# Altium footprint library connectors.PcbLib: 98 footprints (part 3 of 7)
Each footprint in its own frame and in the unit in brackets; x right, y up, seen from the top. Pads: shape width x height; smd on the part's side, far side on the other; paste and mask are expansions set on the pad; w line width, h text height; cw(c..) or ccw(c..) is an arc to the next point about the centre after c.
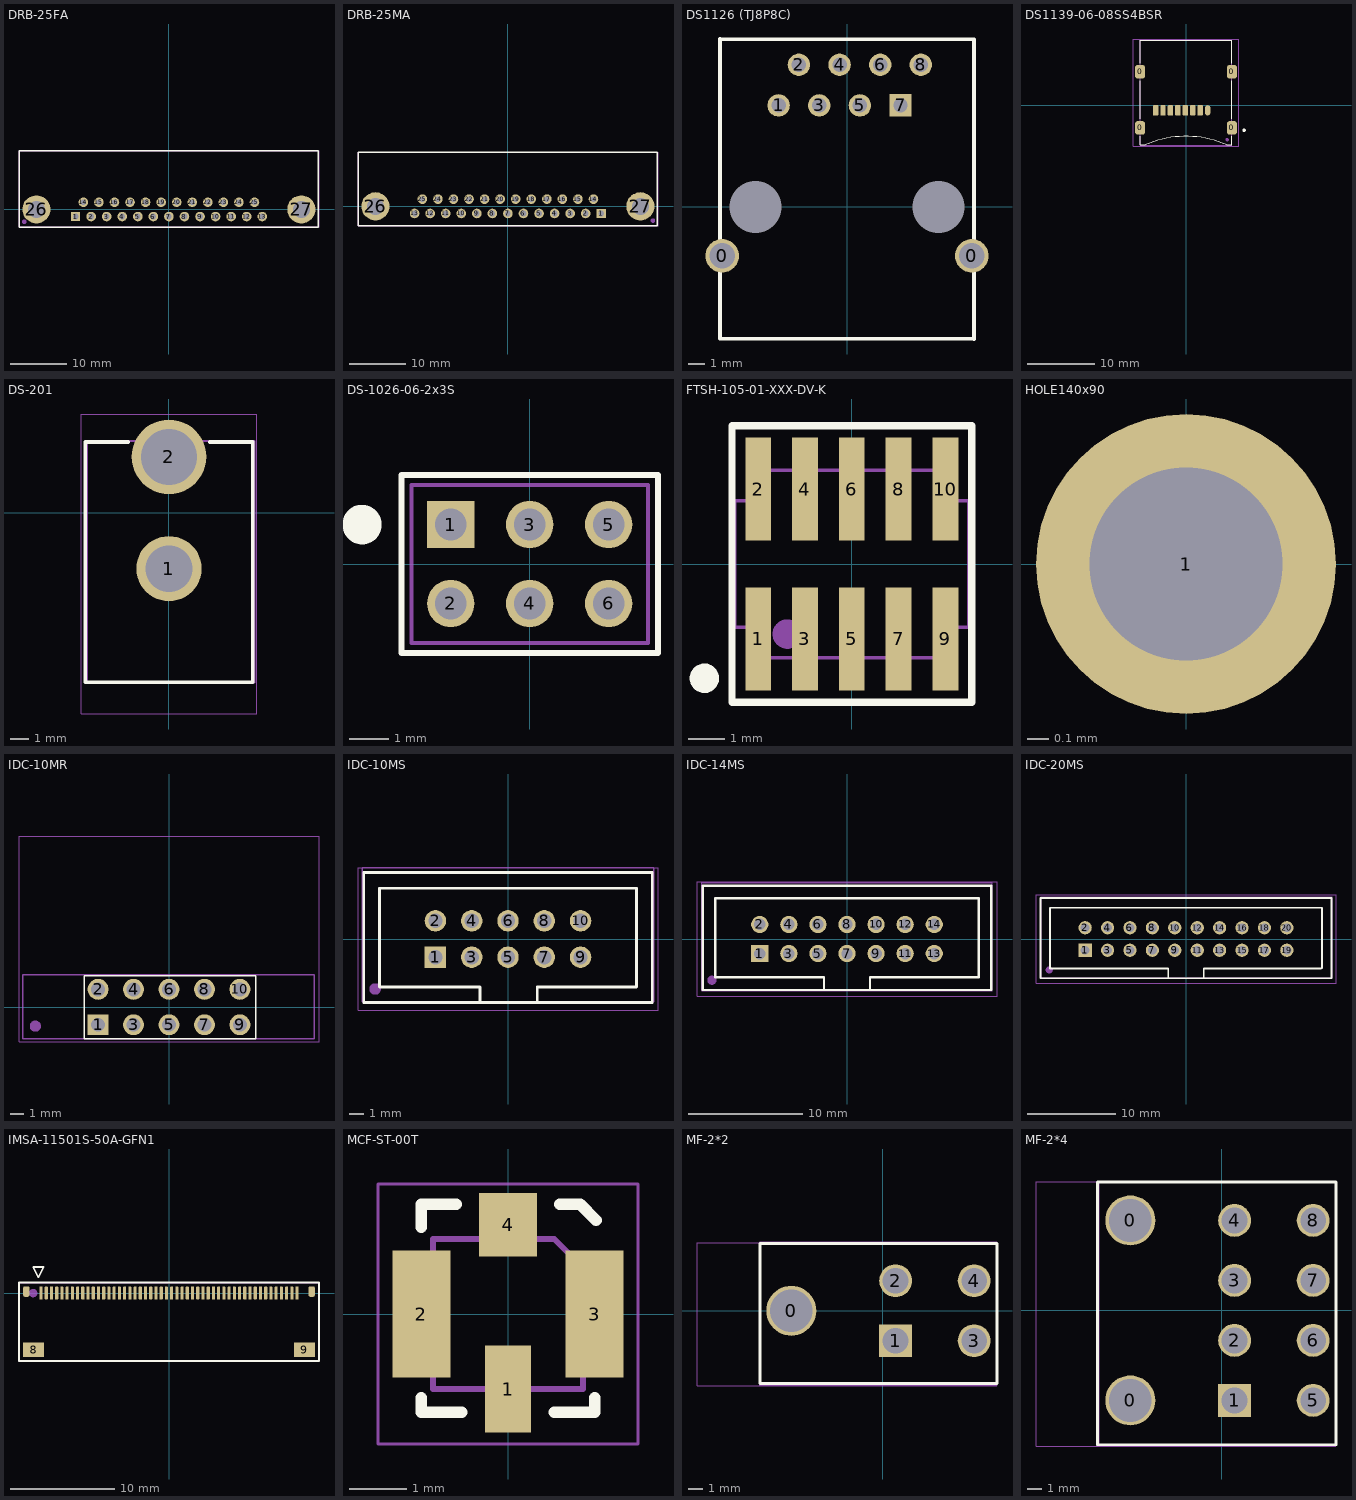
[diagram p2: the footprints below, top view; thin cyan lines are the x and y axes]

## DRB-25FA [mm] "25 Way Right Angled Female D-sub Connector"
height 12.55
pads (27):
  rect 1.6x1.6 hole 1: 1(-16.56,-1.27)
  round 1.7 hole 1: 2(-13.8,-1.27) 3(-11.04,-1.27) 4(-8.28,-1.27) 5(-5.52,-1.27) 6(-2.76,-1.27) 7(0,-1.27) 8(2.76,-1.27) 9(5.52,-1.27) 10(8.28,-1.27) 11(11.04,-1.27) 12(13.8,-1.27) 13(16.56,-1.27) 14(-15.18,1.27) 15(-12.42,1.27) 16(-9.66,1.27) 17(-6.9,1.27) 18(-4.14,1.27) 19(-1.38,1.27) 20(1.38,1.27) 21(4.14,1.27) 22(6.9,1.27) 23(9.66,1.27) 24(12.42,1.27) 25(15.18,1.27)
  round 5 hole 3: 26(-23.5,0) 27(23.5,0)
Top Overlay:
  lines w0.254: -26.6,-3.13 26.5,-3.13 26.5,10.37 -26.6,10.37 -26.6,-3.13
Top Assy:
  circle w0.4: c-25.671,-2.2 r0.2
  lines w0.1: -26.571,-3.1 26.629,-3.1 26.629,10.37 -26.571,10.37 -26.571,-3.1
3D body "User Library-d-sub25 connector(1).step": height 12.67, standoff -4.47, extent -26.52,-3.03 26.52,17.47

## DRB-25MA [mm]
height 12.55
pads (27):
  rect 1.6x1.6 hole 1: 1(16.56,-1.27)
  round 1.7 hole 1: 2(13.8,-1.27) 3(11.04,-1.27) 4(8.28,-1.27) 5(5.52,-1.27) 6(2.76,-1.27) 7(0,-1.27) 8(-2.76,-1.27) 9(-5.52,-1.27) 10(-8.28,-1.27) 11(-11.04,-1.27) 12(-13.8,-1.27) 13(-16.56,-1.27) 14(15.18,1.27) 15(12.42,1.27) 16(9.66,1.27) 17(6.9,1.27) 18(4.14,1.27) 19(1.38,1.27) 20(-1.38,1.27) 21(-4.14,1.27) 22(-6.9,1.27) 23(-9.66,1.27) 24(-12.42,1.27) 25(-15.18,1.27)
  round 5 hole 3: 26(-23.5,0) 27(23.5,0)
Top Overlay:
  lines w0.254: -26.6,-3.43 -26.6,9.57 26.5,9.57 26.5,-3.43 -26.6,-3.43
Top Assy:
  circle w0.4: c25.729,-2.53 r0.2
  lines w0.1: -26.571,-3.43 26.629,-3.43 26.629,9.57 -26.571,9.57 -26.571,-3.43
3D body "User Library-DBPN1M-25.step": height 12.65, standoff -4.72, extent -26.44,-3.504 26.44,15.67

## DS1126 (TJ8P8C) [mm] "Разъем на плату угловой"
height 12.55
pads (12):
  round 2.1 hole 1.6: 0(-7.8,-3.05) 0(7.8,-3.05)
  round 0 hole 3.25 unplated: 0(-5.715,0) 0(5.715,0)
  round 1.4 hole 0.9: 1(-4.275,6.35) 2(-3.005,8.89) 3(-1.735,6.35) 4(-0.465,8.89) 5(0.805,6.35) 6(2.075,8.89) 8(4.615,8.89)
  rect 1.4x1.4 hole 0.9: 7(3.345,6.35)
Top Overlay:
  lines w0.254: -7.925,-8.225 7.925,-8.25 7.925,10.475 -7.925,10.5 -7.925,-8.225
Top Assy:
  lines w0.1: -7.92,-8.23 -7.92,10.5 7.92,10.5 7.92,-8.23 -7.92,-8.23
Top Cortyard:
  lines w0.05: -7.9,-8.225 7.92,-8.225 7.92,10.5 -7.9,10.5 -7.9,-8.225

## DS1139-06-08SS4BSR [mm]
height 2.25
pads (12):
  rrect50% 1.45x2 smd: 0(-6.8,-3.35) 0(-6.8,4.95) 0(6.8,-3.35) 0(6.8,4.95)
  oval 0.8x1.5 smd: 1(3.2,-0.75)
  rrect25% 0.8x1.5 smd: 2(2.1,-0.75) 3(1,-0.75) 4(-0.1,-0.75) 5(-1.2,-0.75) 6(-2.3,-0.75) 7(-3.4,-0.75) 8(-4.5,-0.75)
Top Overlay:
  circle w0.3: c8.6,-3.7 r0.1
  lines w0.15: -6.8,-4.6 -6.8,-5.85 -6,-5.85 cw(c0,-19.589) 6,-5.85 6.8,-5.85 6.8,-4.6 ; -6.8,-2 -6.8,3.6 ; -6.8,6.2 -6.8,9.6 6.8,9.6 6.8,6.2 ; 6.8,-2 6.8,3.6
Top Assy:
  circle w0.3: c6.1,-5.1 r0.1
  lines w0.1: -6.8,-5.9 -6.8,9.6 6.8,9.6 6.8,-5.9 -6.8,-5.9
  text ".Designator" at -3.6,1.1 h1
Top Cortyard:
  lines w0.05: -7.8,-6.1 -7.8,9.8 7.8,9.8 7.8,-6.1 -7.8,-6.1

## DS-201 [mm]
height 11
pads (2):
  round 3.5 hole 2.5: 1(0,-3)
  round 4 hole 3: 2(0,3)
Top Overlay:
  lines w0.2: -2.2,3.8 -4.5,3.8 -4.5,-9.1 4.5,-9.1 4.5,3.8 2.2,3.8
Top Assy:
  lines w0.1: -4.4,-9.1 4.6,-9.1 4.6,3.85 -4.4,3.85 -4.4,-9.1
Top Cortyard:
  lines w0.05: -4.7,-10.8 4.7,-10.8 4.7,5.3 -4.7,5.3 -4.7,-10.8
3D body "pj-037a.stp": height 11, standoff -3.5, extent -4.4,-10.65 4.6,3.85

## DS-1026-06-2x3S [mm]
pads (6):
  rect 1.2x1.2 hole 0.8 mask-25.4: 1(-2,1)
  round 1.2 hole 0.8 mask-25.4: 2(-2,-1) 3(0,1) 4(0,-1) 5(2,1) 6(2,-1)
Top Overlay:
  circle w0.8: c-4.25,1 r0.1
  lines w0.15: -3.25,-2.25 -3.25,2.25 3.25,2.25 3.25,-2.25 -3.25,-2.25
Top Assy:
  circle w0.4: c-2,1 r0.2
  lines w0.1: -3,-2 3,-2 3,2 -3,2 -3,-2
  text ".Designator" at -1.1,-0.017 h1
Top Cortyard:
  lines w0.05: -3.25,-2.25 -3.25,2.25 3.25,2.25 3.25,-2.25 -3.25,-2.25
3D body "User Library-PBD2-2x3.STEP": height 4.75, standoff -2.25, extent -3,-2.05 3,2.05

## FTSH-105-01-XXX-DV-K [mm]
pads (10):
  rect 0.7x2.8 smd mask+0.051: 1(-2.54,-2.032) 2(-2.54,2.032) 3(-1.27,-2.032) 4(-1.27,2.032) 5(0,-2.032) 6(0,2.032) 7(1.27,-2.032) 8(1.27,2.032) 9(2.54,-2.032) 10(2.54,2.032)
Top Overlay:
  circle w0.4: c-4,-3.1 r0.2
  lines w0.2: -3.25,-3.75 -3.25,3.75 3.25,3.75 3.25,-3.75 -3.25,-3.75
Top Assy:
  circle w0.4: c-1.75,-1.9 r0.2
  lines w0.1: -3.175,-1.714 -3.175,1.714 -2.54,1.714 -2.54,2.54 2.54,2.54 2.54,1.714 3.175,1.714 3.175,-1.714 2.54,-1.714 2.54,-2.54 -2.54,-2.54 -2.54,-1.714 -3.175,-1.714
Top Cortyard:
  lines w0.05: -3.25,-3.75 -3.25,3.75 3.25,3.75 3.25,-3.75 -3.25,-3.75
3D body "FTSH-105-01-F-DV-K-TR.stp": height 6.11, standoff -0.01, extent -3.175,-2.921 3.175,2.921

## HOLE140x90 [mm] "1.4mm x 0.9mm Hole Pad"
pads (1):
  round 1.4 hole 0.9: 1(0,0)

## IDC-10MR [mm]
height 10
pads (10):
  rect 1.5x1.5 hole 1: 1(-5.08,-1.27)
  round 1.5 hole 1: 2(-5.08,1.27) 3(-2.54,-1.27) 4(-2.54,1.27) 5(0,-1.27) 6(0,1.27) 7(2.54,-1.27) 8(2.54,1.27) 9(5.08,-1.27) 10(5.08,1.27)
Top Overlay:
  lines w0.1: -6.08,-2.27 6.22,-2.27 6.22,2.23 -6.08,2.23 -6.08,-2.27
Top Assy:
  circle w0.4: c-9.58,-1.37 r0.2
  lines w0.1: -10.48,-2.27 10.42,-2.27 10.42,2.3 -10.48,2.3 -10.48,-2.27
Top Cortyard:
  lines w0.05: -10.75,-2.5 -10.75,12.25 10.75,12.25 10.75,-2.5 -10.75,-2.5
3D body "User Library-IDC Socket Male 10pin Angled THT Goldplated 2_54mm.step": height 8.98, standoff -2.37, extent -10.47,-1.596 10.47,11.964

## IDC-10MS [mm]
pads (10):
  rect 1.5x1.5 hole 1: 1(-5.08,-1.27)
  round 1.5 hole 1: 2(-5.08,1.27) 3(-2.54,-1.27) 4(-2.54,1.27) 5(0,-1.27) 6(0,1.27) 7(2.54,-1.27) 8(2.54,1.27) 9(5.08,-1.27) 10(5.08,1.27)
Top Overlay:
  lines w0.2: -1.95,-4.4 -1.95,-3.35 -9,-3.35 -9,3.55 9,3.55 9,-3.35 2.05,-3.35 2.05,-4.45 ; -10.1,-4.45 -10.1,4.65 10.1,4.65 10.1,-4.45 -10.1,-4.45
Top Assy:
  circle w0.4: c-9.3,-3.5 r0.2
  lines w0.1: -10.2,-4.4 10.2,-4.4 10.2,5 -10.2,5 -10.2,-4.4
Top Cortyard:
  lines w0.05: -10.5,-5 -10.5,5 10.5,5 10.5,-5 -10.5,-5
3D body "User Library-IDC-10MS.STEP": height 9.45, standoff -3.25, extent -10.2,-4.4 10.2,4.95

## IDC-14MS [mm]
pads (14):
  rect 1.5x1.5 hole 1: 1(-7.62,-1.27)
  round 1.5 hole 1: 2(-7.62,1.27) 3(-5.08,-1.27) 4(-5.08,1.27) 5(-2.54,-1.27) 6(-2.54,1.27) 7(0,-1.27) 8(0,1.27) 9(2.54,-1.27) 10(2.54,1.27) 11(5.08,-1.27) 12(5.08,1.27) 13(7.62,-1.27) 14(7.62,1.27)
Top Overlay:
  lines w0.2: -2,-4.4 -2,-3.35 -11.5,-3.35 -11.5,3.55 11.5,3.55 11.5,-3.35 2,-3.35 2,-4.45 ; -12.6,-4.45 -12.6,4.65 12.6,4.65 12.6,-4.45 -12.6,-4.45
Top Assy:
  circle w0.4: c-11.8,-3.6 r0.2
  lines w0.1: -12.7,-4.5 -12.7,4.9 12.7,4.9 12.7,-4.5 -12.7,-4.5
Top Cortyard:
  lines w0.05: -13.1,-5 -13.1,5 13.1,5 13.1,-5 -13.1,-5
3D body "User Library-IDC-14MS.STEP": height 9.45, standoff -3.25, extent -12.7,-4.5 12.7,4.85

## IDC-20MS [mm]
pads (20):
  rect 1.5x1.5 hole 1: 1(-11.43,-1.27)
  round 1.5 hole 1: 2(-11.43,1.27) 3(-8.89,-1.27) 4(-8.89,1.27) 5(-6.35,-1.27) 6(-6.35,1.27) 7(-3.81,-1.27) 8(-3.81,1.27) 9(-1.27,-1.27) 10(-1.27,1.27) 11(1.27,-1.27) 12(1.27,1.27) 13(3.81,-1.27) 14(3.81,1.27) 15(6.35,-1.27) 16(6.35,1.27) 17(8.89,-1.27) 18(8.89,1.27) 19(11.43,-1.27) 20(11.43,1.27)
Top Overlay:
  lines w0.2: -15.4,3.5 -15.4,-3.35 -2,-3.35 -2,-4.4 ; -15.4,3.55 15.4,3.55 15.4,-3.3 ; 2,-4.45 2,-3.35 15.3,-3.35 ; -16.5,-4.45 -16.5,4.65 16.5,4.65 16.5,-4.45 -16.5,-4.45
Top Assy:
  circle w0.4: c-15.5,-3.5 r0.2
  lines w0.1: -16.4,-4.4 16.6,-4.4 16.6,4.8 -16.4,4.8 -16.4,-4.4
Top Cortyard:
  lines w0.05: -17,-5 -17,5 17,5 17,-5 -17,-5
3D body "User Library-BH-20.step": height 9.15, standoff -2.7, extent -16.42,-4.35 16.6,4.75

## IMSA-11501S-50A-GFN1 [mm] "FFC FPC, 50pin, 0.5mm"
height 8
pads (54):
  rect 0.3x1.25 smd: 1(-12.25,0)
  rrect50% 0.3x1.25 smd: 2(-11.75,0) 3(-11.25,0) 4(-10.75,0) 5(-10.25,0) 6(-9.75,0) 7(-9.25,0) 8(-8.75,0) 9(-8.25,0) 10(-7.75,0) 11(-7.25,0) 12(-6.75,0) 13(-6.25,0) 14(-5.75,0) 15(-5.25,0) 16(-4.75,0) 17(-4.25,0) 18(-3.75,0) 19(-3.25,0) 20(-2.75,0) 21(-2.25,0) 22(-1.75,0) 23(-1.25,0) 24(-0.75,0) 25(-0.25,0) 26(0.25,0) 27(0.75,0) 28(1.25,0) 29(1.75,0) 30(2.25,0) 31(2.75,0) 32(3.25,0) 33(3.75,0) 34(4.25,0) 35(4.75,0) 36(5.25,0) 37(5.75,0) 38(6.25,0) 39(6.75,0) 40(7.25,0) 41(7.75,0) 42(8.25,0) 43(8.75,0) 44(9.25,0) 45(9.75,0) 46(10.25,0) 47(10.75,0) 48(11.25,0) 49(11.75,0) 50(12.25,0)
  rrect50% 0.6x1 smd: 8(-13.65,0.15) 8(13.65,0.15)
  rect 2x1.4 smd: 8(-12.95,-5.425) 9(12.95,-5.425)
Top Overlay:
  lines w0.15: -13,2.5 -12,2.5 -12.5,1.5 -13,2.5
  lines w0.2: -14.35,-6.5 -14.35,1 14.35,1 14.35,-6.5 -14.35,-6.5
Top Assy:
  circle w0.4: c-13,0 r0.2
  lines w0.1: -14.356,-6.5 14.351,-6.5 14.351,1 -14.356,1 -14.356,-6.5
Top Cortyard:
  lines w0.05: -14.353,-6.5 14.348,-6.5 14.348,1 -14.353,1 -14.353,-6.5

## MCF-ST-00T [mm]
pads (4):
  rect 0.8x1.5 smd: 1(0,-1.3)
  rect 1x2.2 smd: 2(-1.5,0) 3(1.5,0)
  rect 1x1.1 smd: 4(0,1.55)
Top Overlay:
  lines w0.2: -1.5,-1.45 -1.5,-1.7 -0.8,-1.7 ; -1.5,1.5 -1.5,1.9 -0.9,1.9 ; 0.8,-1.7 1.5,-1.7 1.5,-1.45 ; 0.9,1.9 1.25,1.9 1.525,1.625
Top Assy:
  lines w0.1: -1.3,-1.3 1.3,-1.3 1.3,0.8 0.8,1.3 -1.3,1.3 -1.3,-1.3
Top Cortyard:
  lines w0.05: -2.25,-2.25 2.25,-2.25 2.25,2.25 -2.25,2.25 -2.25,-2.25

## MF-2*2 [mm]
pads (5):
  round 3.5 hole 3: 0(-6.4,0)
  rect 2.3x2.3 hole 1.8: 1(0.9,-2.1)
  round 2.3 hole 1.8: 2(0.9,2.1) 3(6.4,-2.1) 4(6.4,2.1)
Top Overlay:
  lines w0.2: -8.6,-5.1 -8.6,4.7 8,4.7 8,-5.1 -8.6,-5.1
Top Assy:
  lines w0.1: -8.6,-5.2 -8.6,4.8 8,4.8 8,-5.2 -8.6,-5.2
Top Cortyard:
  lines w0.05: -13,-5.25 8,-5.25 8,4.75 -13,4.75 -13,-5.25
3D body "4761.stp": height 11.4, standoff -3.6, extent -12.967,-5.2 6.968,4.8

## MF-2*4 [mm]
pads (10):
  round 3.5 hole 3: 0(-6.4,-6.3) 0(-6.4,6.3)
  rect 2.3x2.3 hole 1.8: 1(0.9,-6.3)
  round 2.3 hole 1.8: 2(0.9,-2.1) 3(0.9,2.1) 4(0.9,6.3) 5(6.4,-6.3) 6(6.4,-2.1) 7(6.4,2.1) 8(6.4,6.3)
Top Overlay:
  lines w0.2: -8.7,-9.4 8,-9.4 8,9 -8.7,9 -8.7,-9.4
Top Assy:
  lines w0.1: -8.6,-9.4 8,-9.4 8,9 -8.6,9 -8.6,-9.4
Top Cortyard:
  lines w0.05: -13,-9.5 -13,9 8,9 8,-9.5 -13,-9.5
3D body "4767.stp": height 11.4, standoff -3.6, extent -12.968,-9.4 6.967,9